# Altium footprint library 常用元件封装库.PcbLib: 1310 footprints (part 65 of 83)
Each footprint in its own frame and in the unit in brackets; x right, y up, seen from the top. Pads: shape width x height; smd on the part's side, far side on the other; paste and mask are expansions set on the pad; w line width, h text height; cw(c..) or ccw(c..) is an arc to the next point about the centre after c.
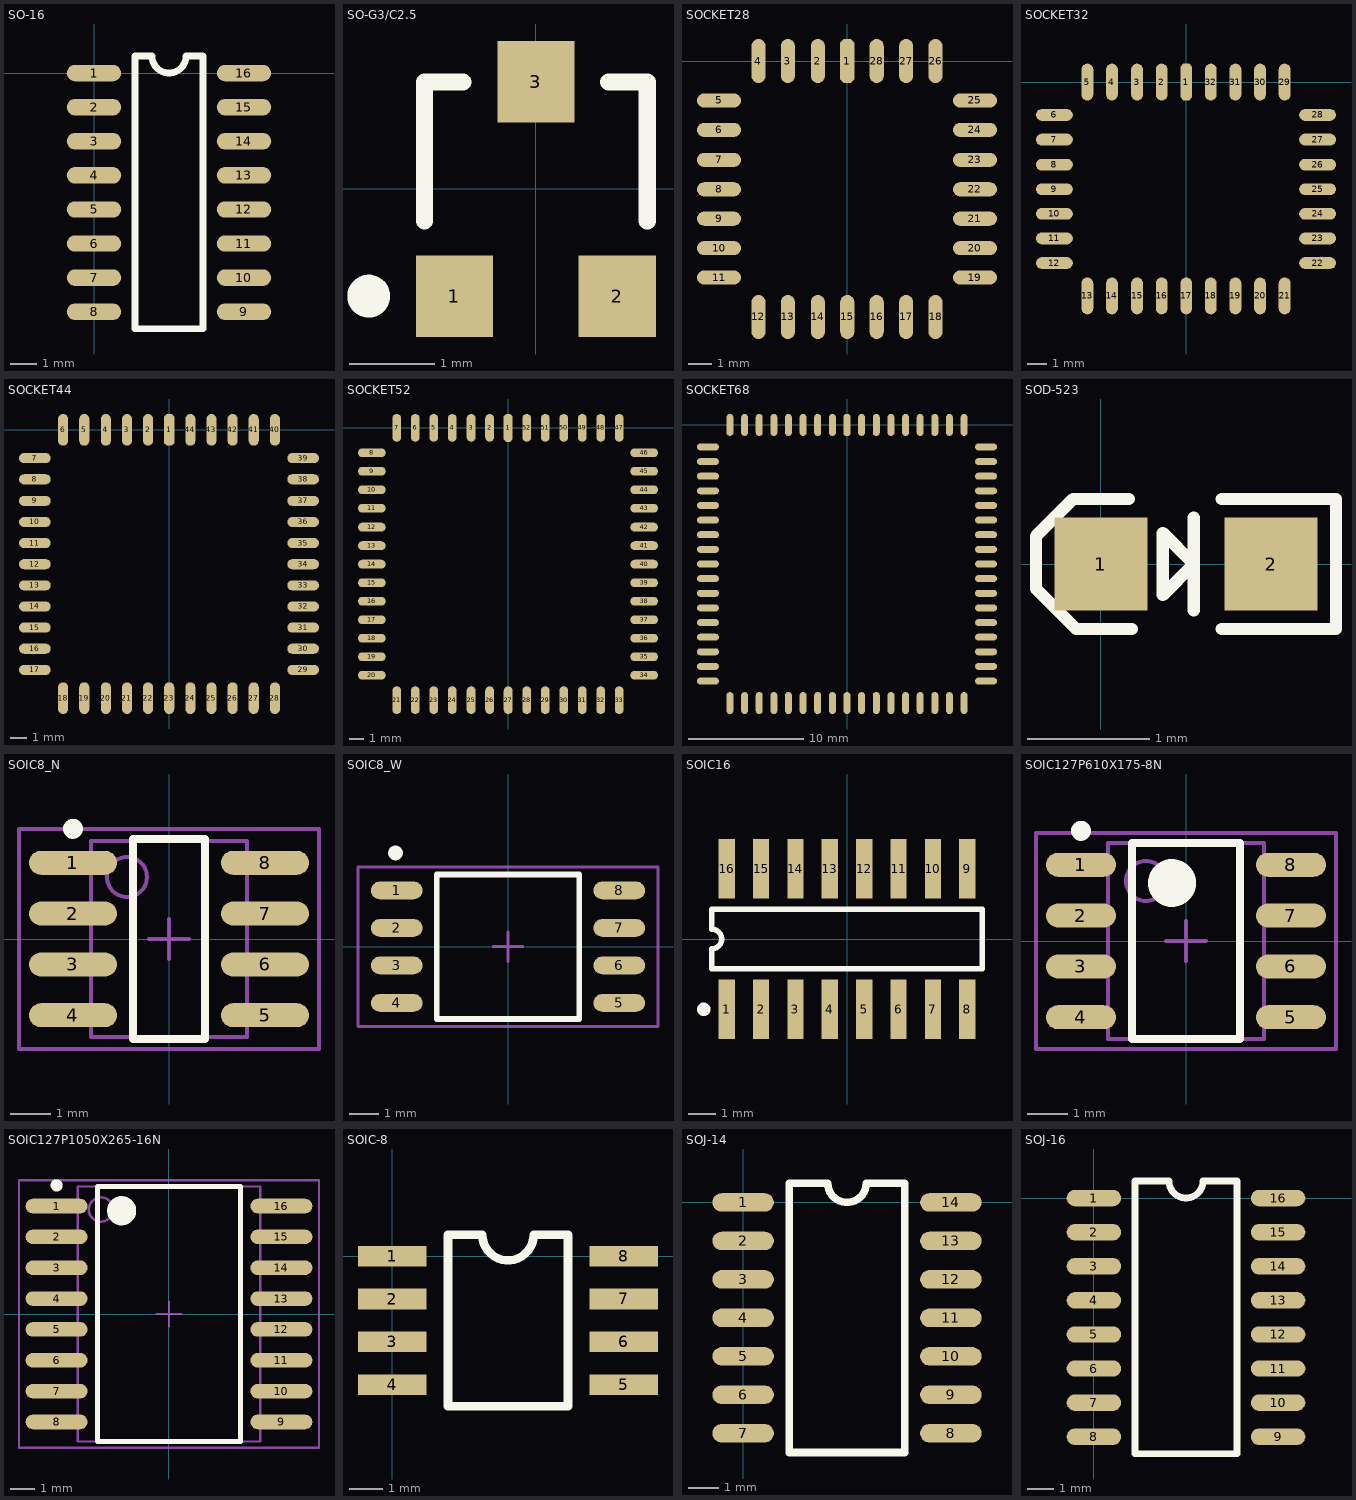
[diagram p64: the footprints below, top view; thin cyan lines are the x and y axes]

## SO-16 [mil]
pads (16):
  oval 80x24 smd: 1(0,0) 2(0,-50) 3(0,-100) 4(0,-150) 5(0,-200) 6(0,-250) 7(0,-300) 8(0,-350) 9(220,-350) 10(220,-300) 11(220,-250) 12(220,-200) 13(220,-150) 14(220,-100) 15(220,-50) 16(220,0)
Top Overlay:
  lines w10: 60,-375 60,25 85,25 ccw(c110,25) 135,25 160,25 160,-375 60,-375

## SO-G3/C2.5 [mm]
pads (3):
  rect 0.9x0.95 smd: 1(-0.95,-1.25) 2(0.95,-1.25) 3(0,1.25)
Top Overlay:
  circle w0.25: c-1.95,-1.25 r0.125
  lines w0.2: -1.3,-0.375 -1.3,1.25 -0.85,1.25 ; 0.85,1.25 1.3,1.25 1.3,-0.375

## SOCKET28 [mil]
pads (28):
  oct 24x75 smd: 1(0,0)
  oval 24x75 smd: 2(-50,0) 3(-101,0) 4(-151,0) 12(-151,-435) 13(-101,-435) 14(-50,-435) 15(0,-435) 16(50,-435) 17(100,-435) 18(150,-435) 26(150,0) 27(100,0) 28(50,0)
  oval 75x24 smd: 5(-218,-67) 6(-218,-117) 7(-218,-168) 8(-218,-218) 9(-218,-268) 10(-218,-318) 11(-218,-368) 19(217,-368) 20(217,-318) 21(217,-268) 22(217,-218) 23(217,-168) 24(217,-117) 25(217,-67)

## SOCKET32 [mil]
pads (32):
  oct 24x75 smd: 1(0,0)
  oval 24x75 smd: 2(-50,0) 3(-100,0) 4(-151,0) 5(-201,0) 13(-201,-435) 14(-151,-435) 15(-100,-435) 16(-50,-435) 17(0,-435) 18(50,-435) 19(100,-435) 20(150,-435) 21(200,-435) 29(200,0) 30(150,0) 31(100,0) 32(50,0)
  oval 75x24 smd: 6(-268,-67) 7(-268,-117) 8(-268,-168) 9(-268,-218) 10(-268,-268) 11(-268,-318) 12(-268,-368) 22(267,-368) 23(267,-318) 24(267,-268) 25(267,-218) 26(267,-168) 27(267,-117) 28(267,-67)

## SOCKET44 [mil]
pads (44):
  oct 24x75 smd: 1(0,0)
  oval 24x75 smd: 2(-50,0) 3(-100,0) 4(-150,0) 5(-201,0) 6(-251,0) 18(-251,-635) 19(-201,-635) 20(-150,-635) 21(-100,-635) 22(-50,-635) 23(0,-635) 24(50,-635) 25(100,-635) 26(150,-635) 27(200,-635) 28(250,-635) 40(250,0) 41(200,0) 42(150,0) 43(100,0) 44(50,0)
  oval 75x24 smd: 7(-318,-67) 8(-318,-117) 9(-318,-168) 10(-318,-218) 11(-318,-268) 12(-318,-318) 13(-318,-368) 14(-318,-418) 15(-318,-468) 16(-318,-518) 17(-318,-568) 29(317,-568) 30(317,-518) 31(317,-468) 32(317,-418) 33(317,-368) 34(317,-318) 35(317,-268) 36(317,-218) 37(317,-168) 38(317,-117) 39(317,-67)

## SOCKET52 [mil]
pads (52):
  oct 24x75 smd: 1(0,0)
  oval 24x75 smd: 2(-50,0) 3(-100,0) 4(-151,0) 5(-201,0) 6(-251,0) 7(-301,0) 21(-301,-735) 22(-251,-735) 23(-201,-735) 24(-151,-735) 25(-100,-735) 26(-50,-735) 27(0,-735) 28(50,-735) 29(100,-735) 30(150,-735) 31(200,-735) 32(250,-735) 33(300,-735) 47(300,0) 48(250,0) 49(200,0) 50(150,0) 51(100,0) 52(50,0)
  oval 75x24 smd: 8(-368,-67) 9(-368,-117) 10(-368,-167) 11(-368,-217) 12(-368,-268) 13(-368,-318) 14(-368,-368) 15(-368,-418) 16(-368,-468) 17(-368,-518) 18(-368,-568) 19(-368,-618) 20(-368,-668) 34(367,-668) 35(367,-618) 36(367,-568) 37(367,-518) 38(367,-468) 39(367,-418) 40(367,-368) 41(367,-318) 42(367,-268) 43(367,-217) 44(367,-167) 45(367,-117) 46(367,-67)

## SOCKET68 [mil]
pads (68):
  oct 24x75 smd: 1(0,0)
  oval 24x75 smd: 2(-50,0) 3(-100,0) 4(-150,0) 5(-200,0) 6(-250,0) 7(-300,0) 8(-350,0) 9(-400,0) 27(-400,-950) 28(-350,-950) 29(-300,-950) 30(-250,-950) 31(-200,-950) 32(-150,-950) 33(-100,-950) 34(-50,-950) 35(0,-950) 36(50,-950) 37(100,-950) 38(150,-950) 39(200,-950) 40(250,-950) 41(300,-950) 42(350,-950) 43(400,-950) 61(400,0) 62(350,0) 63(300,0) 64(250,0) 65(200,0) 66(150,0) 67(100,0) 68(50,0)
  oval 75x24 smd: 10(-475,-75) 11(-475,-125) 12(-475,-175) 13(-475,-225) 14(-475,-275) 15(-475,-325) 16(-475,-375) 17(-475,-425) 18(-475,-475) 19(-475,-525) 20(-475,-575) 21(-475,-625) 22(-475,-675) 23(-475,-725) 24(-475,-775) 25(-475,-825) 26(-475,-875) 44(475,-875) 45(475,-825) 46(475,-775) 47(475,-725) 48(475,-675) 49(475,-625) 50(475,-575) 51(475,-525) 52(475,-475) 53(475,-425) 54(475,-375) 55(475,-325) 56(475,-275) 57(475,-225) 58(475,-175) 59(475,-125) 60(475,-75)

## SOD-523 [mil]
pads (2):
  rect 30x30 smd: 1(0,0) 2(55,0)
Top Overlay:
  lines w4: 9,21 -9,21 -21,9 -21,-8 -8,-21 10,-21 ; 30,-15 30,15 ; 39,-21 76,-21 76,21 39,21 ; 20,-10 30,0 20,10 20,-10

## SOIC8_N [mm] "8-Pin Small Outline Integrated Circuit Package (SOIC8), IPC Medium Density"
height 1.75
pads (8):
  oval 2.2x0.6 smd: 1(-2.4,1.905) 2(-2.4,0.635) 3(-2.4,-0.635) 4(-2.4,-1.905) 5(2.4,-1.905) 6(2.4,-0.635) 7(2.4,0.635) 8(2.4,1.905)
Top Overlay:
  circle w0.25: c-2.4,2.755 r0.125
  lines w0.2: -0.9,-2.5 -0.9,2.5 0.9,2.5 0.9,-2.5 -0.9,-2.5
Mechanical 13:
  circle w0.1: c-1.05,1.55 r0.5
  lines w0.1: -1.95,-2.45 -1.95,2.45 1.95,2.45 1.95,-2.45 -1.95,-2.45
Mechanical 15:
  lines w0.1: -0.5,0 0.5,0 ; 0,-0.5 0,0.5 ; -3.75,-2.75 -3.75,2.75 3.75,2.75 3.75,-2.75 -3.75,-2.75
3D body: height 1.75, standoff 0, extent -1.95,-2.45 1.95,2.45

## SOIC8_W [mm] "SPI_FLASH"
height 1.75
pads (8):
  oval 1.75x0.6 smd: 1(-3.768,1.905) 2(-3.768,0.635) 3(-3.768,-0.635) 4(-3.768,-1.905) 5(3.768,-1.905) 6(3.768,-0.635) 7(3.768,0.635) 8(3.768,1.905)
Top Overlay:
  circle w0.25: c-3.808,3.175 r0.125
  lines w0.2: -2.413,-2.45 2.413,-2.45 2.413,2.45 -2.413,2.45 -2.413,-2.45
Mechanical 15:
  lines w0.1: -0.5,0 0.5,0 ; 0,-0.5 0,0.5 ; -5.08,-2.7 5.08,-2.7 5.08,2.7 -5.08,2.7 -5.08,-2.7

## SOIC16 [mm] "Small Outline; 16 Leads; Body Width 3.9 mm; Pitch 1.27 mm"
height 1.75
pads (16):
  rect 0.6x2.2 smd: 1(-4.445,-2.6) 2(-3.175,-2.6) 3(-1.905,-2.6) 4(-0.635,-2.6) 5(0.635,-2.6) 6(1.905,-2.6) 7(3.175,-2.6) 8(4.445,-2.6) 9(4.445,2.6) 10(3.175,2.6) 11(1.905,2.6) 12(0.635,2.6) 13(-0.635,2.6) 14(-1.905,2.6) 15(-3.175,2.6) 16(-4.445,2.6)
Top Overlay:
  circle w0.25: c-5.295,-2.6 r0.125
  lines w0.2: -5,-1.1 5,-1.1 5,1.1 -5,1.1 -5,0.367 cw(c-5,0) -5,-0.367 -5,-1.1

## SOIC127P610X175-8N [mm] "ACS712"
height 1.75
pads (8):
  oval 1.75x0.6 smd: 1(-2.625,1.905) 2(-2.625,0.635) 3(-2.625,-0.635) 4(-2.625,-1.905) 5(2.625,-1.905) 6(2.625,-0.635) 7(2.625,0.635) 8(2.625,1.905)
Top Overlay:
  circle w0.6: c-0.35,1.45 r0.3
  circle w0.25: c-2.625,2.755 r0.125
  lines w0.2: -1.35,-2.45 1.35,-2.45 1.35,2.45 -1.35,2.45 -1.35,-2.45
Mechanical 13:
  circle w0.1: c-1,1.5 r0.5
  lines w0.1: -1.95,-2.45 1.95,-2.45 1.95,2.45 -1.95,2.45 -1.95,-2.45
Mechanical 15:
  lines w0.1: -0.5,0 0.5,0 ; 0,-0.5 0,0.5 ; -3.75,-2.7 3.75,-2.7 3.75,2.7 -3.75,2.7 -3.75,-2.7
3D body: height 1, standoff 0.1, extent -1.95,-2.45 1.95,2.45

## SOIC127P1050X265-16N [mm] "SOIC SMB460"
height 2.65
pads (16):
  oval 2.55x0.6 smd: 1(-4.625,4.445) 2(-4.625,3.175) 3(-4.625,1.905) 4(-4.625,0.635) 5(-4.625,-0.635) 6(-4.625,-1.905) 7(-4.625,-3.175) 8(-4.625,-4.445) 9(4.625,-4.445) 10(4.625,-3.175) 11(4.625,-1.905) 12(4.625,-0.635) 13(4.625,0.635) 14(4.625,1.905) 15(4.625,3.175) 16(4.625,4.445)
Top Overlay:
  circle w0.6: c-1.95,4.25 r0.3
  circle w0.25: c-4.625,5.295 r0.125
  lines w0.2: -2.95,-5.25 2.95,-5.25 2.95,5.25 -2.95,5.25 -2.95,-5.25
Mechanical 13:
  circle w0.1: c-2.8,4.3 r0.5
  lines w0.1: -3.75,-5.25 3.75,-5.25 3.75,5.25 -3.75,5.25 -3.75,-5.25
Mechanical 15:
  lines w0.1: -0.5,0 0.5,0 ; 0,-0.5 0,0.5 ; -6.175,-5.5 6.175,-5.5 6.175,5.5 -6.175,5.5 -6.175,-5.5
3D body: height 2.65, standoff 0.1, extent -3.75,-5.25 3.75,5.25

## SOIC-8 [mil]
pads (8):
  rect 80x24 smd: 1(0,0) 2(0,-50.06) 3(0,-100.06) 4(0,-150.06) 5(270,-150) 6(270,-100) 7(270,-50) 8(270,0)
Top Overlay:
  lines w10: 75,24.94 75.06,25 105,25 ccw(c135,25) 165,25 204.94,25 205,24.94 205,-175.06 65,-175.06 65,24.94 95,24.94
3D body "User Library-SOIC8_JEDEC_MS-012AA.STEP": height 68.7, standoff -0.31, extent 12.97,-173.43 257.03,23.42

## SOJ-14 [mil]
pads (14):
  oval 80x24 smd: 1(0,0) 2(0,-50) 3(0,-100) 4(0,-150) 5(0,-200) 6(0,-250) 7(0,-300) 8(270,-300) 9(270,-250) 10(270,-200) 11(270,-150) 12(270,-100) 13(270,-50) 14(270,0)
Top Overlay:
  lines w10: 60,-325 60,25 110,25 ccw(c135,25) 160,25 210,25 210,-325 60,-325

## SOJ-16 [mil]
pads (16):
  oval 80x24 smd: 1(0,0) 2(0,-50) 3(0,-100) 4(0,-150) 5(0,-200) 6(0,-250) 7(0,-300) 8(0,-350) 9(270,-350) 10(270,-300) 11(270,-250) 12(270,-200) 13(270,-150) 14(270,-100) 15(270,-50) 16(270,0)
Top Overlay:
  lines w10: 60,-375 60,25 110,25 ccw(c135,25) 160,25 210,25 210,-375 60,-375